# Altium footprint library LukaLIBRARY.PcbLib: 784 footprints (part 45 of 49)
Each footprint in its own frame and in the unit in brackets; x right, y up, seen from the top. Pads: shape width x height; smd on the part's side, far side on the other; paste and mask are expansions set on the pad; w line width, h text height; cw(c..) or ccw(c..) is an arc to the next point about the centre after c.
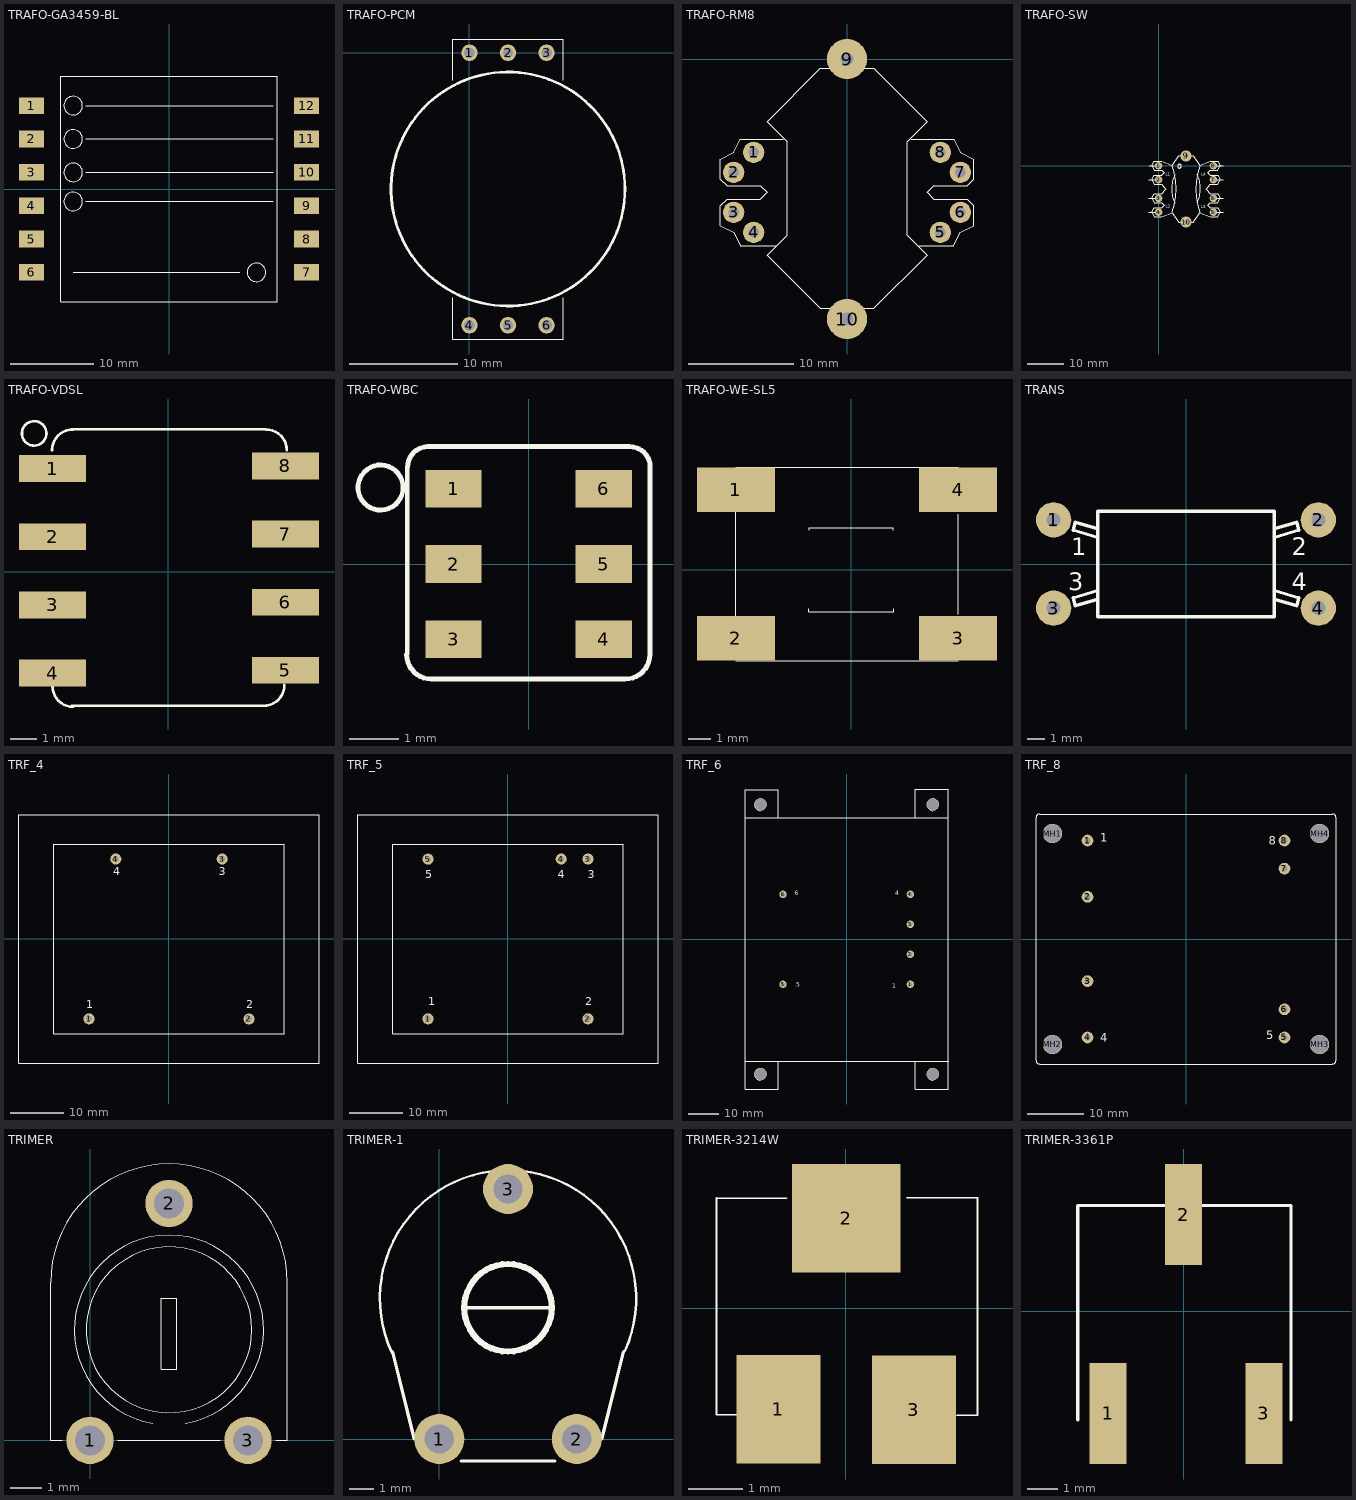
[diagram p44: the footprints below, top view; thin cyan lines are the x and y axes]

## TRAFO-GA3459-BL [mm]
pads (12):
  rect 3x2 smd mask-25.4: 1(-16.5,10) 2(-16.5,6) 3(-16.5,2) 4(-16.5,-2) 5(-16.5,-6) 6(-16.5,-10) 7(16.5,-10) 8(16.5,-6) 9(16.5,-2) 10(16.5,2) 11(16.5,6) 12(16.5,10)
Top Overlay:
  circle w0.01: c-11.5,-1.5 r1.118
  circle w0.01: c-11.5,6 r1.118
  circle w0.01: c10.5,-10 r1.118
  circle w0.01: c-11.5,10 r1.118
  circle w0.01: c-11.5,2 r1.118
  lines w0.01: -11.5,-10 8.5,-10 ; -10,-1.5 12.5,-1.5 ; -10,2 12.5,2 ; -10,6 12.5,6 ; -10,10 12.5,10 ; -10,10 12.5,10 ; -10,10 12.5,10 ; -13,-13.5 -13,13.5 13,13.5 13,-13.5 -13,-13.5
Top Solder:
  region: -18,-11 -15,-11 -15,-9 -18,-9
  region: -18,-3 -15,-3 -15,-1 -18,-1
  region: -18,5 -15,5 -15,7 -18,7
  region: -18,-7 -15,-7 -15,-5 -18,-5
  region: -18,1 -15,1 -15,3 -18,3
  region: -18,9 -15,9 -15,11 -18,11
  region: 15,-11 18,-11 18,-9 15,-9
  region: 15,-3 18,-3 18,-1 15,-1
  region: 15,5 18,5 18,7 15,7
  region: 15,-7 18,-7 18,-5 15,-5
  region: 15,1 18,1 18,3 15,3
  region: 15,9 18,9 18,11 15,11

## TRAFO-PCM [mil]
pads (6):
  round 60 hole 38: 1(0,0) 2(140,0) 3(280,0) 4(0,-990) 5(140,-990) 6(280,-990)
Top Overlay:
  circle w10: c140,-495 r425
  lines w1: -60,-890 -60,-1040 340,-1040 340,-890 ; -60,-100 -60,50 340,50 340,-100

## TRAFO-RM8 [mil]
pads (10):
  round 80 hole 40: 1(-350,-350) 2(-425,-425) 3(-425,-575) 4(-350,-650) 5(350,-650) 6(425,-575) 7(425,-425) 8(350,-350)
  round 150 hole 50: 9(0,0) 10(0,-975)
Top Overlay:
  lines w3.94: -265,-700 -400,-700 -425,-650 -475,-625 -475,-550 -450,-525 -325,-525 -300,-500 -325,-475 -450,-475 -475,-450 -475,-375 -425,-350 -400,-300 -240,-300 ; 225,-535 225,-310 300,-235 100,-35 0,-35 -100,-35 -300,-235 -225,-310 -225,-510 -225,-660 -300,-735 -100,-935 0,-935 100,-935 300,-735 225,-660 225,-510 ; 240,-300 400,-300 425,-350 475,-375 475,-450 450,-475 325,-475 300,-500 325,-525 450,-525 475,-550 475,-625 425,-650 400,-700 270,-700

## TRAFO-SW [mil]
pads (10):
  round 80 hole 40 mask-1000: 1(0,0) 2(0,-150) 3(0,-350) 4(0,-500) 5(590,-500) 6(590,-350) 7(590,-150) 8(590,0)
  round 120 hole 40 mask-1000: 9(295,105) 10(295,-605)
Top Overlay:
  circle w7.87: c225,-5 r20
  lines w7.87: -105,-500 -30,-500 ; -105,-350 -30,-350 ; -105,-150 -30,-150 ; -100,0 -30,0 ; 144.9,-500.28 ccw(c-565,-247.5) 144.9,5.28 ; 174.88,-404.75 cw(c495,-250) 174.88,-95.25 ; 265,-605 215,-605 145,-505 35,-550 -45,-550 -75,-500 -45,-450 35,-450 60,-425 35,-400 -45,-400 -75,-350 -45,-300 35,-300 75,-250 35,-200 -45,-200 -75,-150 -45,-100 35,-100 60,-75 35,-50 -45,-50 -75,0 -45,50 35,50 145,5 215,105 265,105 ; 325,-605 375,-605 445,-505 555,-550 635,-550 665,-500 635,-450 555,-450 530,-425 555,-400 635,-400 665,-350 635,-300 555,-300 515,-250 555,-200 635,-200 665,-150 635,-100 555,-100 530,-75 555,-50 635,-50 665,0 635,50 555,50 445,5 375,105 325,105 ; 415.12,-399.75 ccw(c95,-245) 415.12,-90.25 ; 445.1,-505.28 cw(c1155,-252.5) 445.1,0.28 ; 620,-500 695,-500 ; 620,-350 695,-350 ; 620,-150 695,-150 ; 620,0 695,0
  text "L3" at 460,-455 h31.25
  text "L4" at 460,-105 h31.25
  text "L2" at 75,-450 h31.25
  text "L1" at 75,-110 h31.25
Top Solder:
  drawing of 10 lines, arcs and shapes, not listed
Bottom Solder:
  drawing of 10 lines, arcs and shapes, not listed

## TRAFO-VDSL [mm]
pads (8):
  rect 2.5x1 smd mask-25.4: 1(-4.32,3.84) 2(-4.32,1.3) 3(-4.32,-1.24) 4(-4.32,-3.78) 5(4.36,-3.68) 6(4.36,-1.14) 7(4.36,1.4) 8(4.36,3.94)
Top Overlay:
  circle w0.1: c-5.005,5.151 r0.457
  lines w0.1: -4.34,4.519 cw(c-3.567,4.519) -3.567,5.293 ; -4.32,-4.269 ccw(c-3.547,-4.269) -3.547,-5.043 ; -3.6,-5 3.53,-5 ; -3.6,5.3 3.6,5.3 ; 3.547,-5.003 ccw(c3.547,-4.229) 4.32,-4.229 ; 3.637,5.293 cw(c3.637,4.519) 4.41,4.519
Top Solder:
  region: -5.57,-1.74 -3.07,-1.74 -3.07,-0.74 -5.57,-0.74
  region: -5.57,-4.28 -3.07,-4.28 -3.07,-3.28 -5.57,-3.28
  region: -5.57,3.34 -3.07,3.34 -3.07,4.34 -5.57,4.34
  region: 3.11,-4.18 5.61,-4.18 5.61,-3.18 3.11,-3.18
  region: 3.11,-1.64 5.61,-1.64 5.61,-0.64 3.11,-0.64
  region: 3.11,3.44 5.61,3.44 5.61,4.44 3.11,4.44
  region: -5.57,0.8 -3.07,0.8 -3.07,1.8 -5.57,1.8
  region: 3.11,0.9 5.61,0.9 5.61,1.9 3.11,1.9

## TRAFO-WBC [mil]
pads (6):
  rect 45x30 smd mask-1000: 1(-60,60) 2(-60,0) 3(-60,-60) 4(60,-60) 5(60,0) 6(60,60)
Top Overlay:
  circle w3.94: c-118.31,61.06 r18
  lines w3.94: -97.46,-72.2 ccw(c-77.78,-72.2) -77.78,-91.89 ; -97,-72 -97,78 ; -96.69,77.52 cw(c-80.57,77.52) -80.57,93.63 ; -81,94 80,94 ; -78,-92 76,-92 ; 77.15,-91.89 ccw(c77.15,-72.2) 96.83,-72.2 ; 80.94,93.63 cw(c80.94,77.52) 97.06,77.52 ; 97,-71 97,79
Top Solder:
  region: -103.31,-43.31 -16.69,-43.31 -16.69,43.31 -103.31,43.31
  region: -103.31,16.69 -16.69,16.69 -16.69,103.31 -103.31,103.31
  region: -103.31,-103.31 -16.69,-103.31 -16.69,-16.69 -103.31,-16.69
  region: 16.69,16.69 103.31,16.69 103.31,103.31 16.69,103.31
  region: 16.69,-43.31 103.31,-43.31 103.31,43.31 16.69,43.31
  region: 16.69,-103.31 103.31,-103.31 103.31,-16.69 16.69,-16.69

## TRAFO-WE-SL5 [mm]
pads (4):
  rect 3.5x2 smd mask-25.4: 1(-5.2,3.6) 2(-5.2,-3.1) 3(4.8,-3.1) 4(4.8,3.6)
Top Overlay:
  lines w0.03: -5.2,-4.1 4.8,-4.1 ; -5.2,-2.1 -5.2,2.6 ; -5.2,4.6 4.8,4.6 ; -1.91,-1.76 -1.91,-1.9 1.9,-1.9 1.9,-1.76 ; -1.9,1.76 -1.9,1.89 1.89,1.89 1.89,1.77 ; 4.8,-2 4.8,2.5
Top Solder:
  region: 6.55,-2.1 3.05,-2.1 3.05,-4.1 6.55,-4.1
  region: 6.55,4.6 3.05,4.6 3.05,2.6 6.55,2.6
  region: -3.45,4.6 -6.95,4.6 -6.95,2.6 -3.45,2.6
  region: -3.45,-2.1 -6.95,-2.1 -6.95,-4.1 -3.45,-4.1

## TRANS [mm] "Transformer; 4 Leads"
pads (4):
  round 2 hole 0.8: 1(-7.5,2.5) 2(7.5,2.5) 3(-7.5,-2.5) 4(7.5,-2.5)
Top Overlay:
  lines w0.2: -5,-2 -6.275,-2.375 -6.4,-1.925 -5,-1.5 ; -5,1.5 -6.4,1.925 -6.275,2.375 -5,2 ; 5,-2 6.275,-2.375 6.4,-1.925 5,-1.5 ; 5,1.5 6.4,1.925 6.275,2.375 5,2 ; -5,-3 5,-3 5,3 -5,3 -5,-3
  text "1" at -6.5,0.5 h1
  text "2" at 6,0.5 h1
  text "3" at -6.675,-1.5 h1
  text "4" at 6,-1.5 h1

## TRF_4 [mil] "Transformer; 4 Leads"
pads (4):
  round 82 hole 42: 1(-590.83,-590) 2(590.83,-590.83) 3(393.33,590.83) 4(-393.33,590.83)
Top Overlay:
  lines w8: -1108.33,-916.67 1108.33,-916.67 1108.33,916.67 -1108.33,916.67 -1108.33,-916.67 ; -850,-700 -850,700 850,700 850,-700 -850,-700
  text "1" at -610.83,-510 h59.06
  text "2" at 569.17,-510 h59.06
  text "4" at -410.83,470 h59.06
  text "3" at 369.17,470 h59.06

## TRF_5 [mil] "Transformer; 5 Leads"
pads (5):
  round 82 hole 42: 1(-590.83,-590.42) 2(590.83,-590.42) 3(590.83,590.42) 4(393.33,590.42) 5(-590.83,589.58)
Top Overlay:
  lines w8: -1108.33,-917.08 1108.33,-917.08 1108.33,916.25 -1108.33,916.25 -1108.33,-917.08 ; -850,-700.42 -850,699.58 850,699.58 850,-700.42 -850,-700.42
  text "2" at 569.17,-490.42 h59.06
  text "3" at 589.17,449.58 h59.06
  text "4" at 369.17,449.58 h59.06
  text "1" at -590.83,-490.42 h59.06
  text "5" at -610.83,449.58 h59.06

## TRF_6 [mil] "Transformer; 6 Leads"
pads (10):
  round 98 hole 52: 1(836.67,-590.83) 2(836.67,-196.67) 3(836.67,196.67) 4(836.67,590.83) 5(-836.67,-590.83) 6(-836.67,590.83)
  round 165 hole 152: MH1(-1131.67,-1771.67) MH2(1131.67,-1771.67) MH3(1131.67,1771.67) MH4(-1131.67,1771.67)
Top Overlay:
  lines w8: -1333.33,-1600 1341.67,-1600 ; -1333.33,1600 1333.33,1600 ; -1133.33,-1850 cw(c-1133.33,-1775) -1133.33,-1700 ; -1133.33,1691.67 cw(c-1133.33,1766.67) -1133.33,1841.67 ; -900,-1600 -900,-1966.67 -1333.33,-1966.67 -1333.33,1966.67 -900,1966.67 -900,1600 ; 900,-1600 900,-1966.67 1333.33,-1966.67 1333.33,1966.67 ; 900,1600 900,1975 1333.33,1975 ; 1133.33,-1850 cw(c1133.33,-1775) 1133.33,-1700 ; 1133.33,1691.67 cw(c1133.33,1766.67) 1133.33,1841.67
  text "6" at -680,580 h59.06
  text "4" at 640,580 h59.06
  text "1" at 600,-640 h59.06
  text "5" at -660,-620 h59.06

## TRF_8 [mil] "Transformer; 8 Leads"
pads (12):
  round 82 hole 42: 1(-689.17,689.17) 2(-689.17,295) 3(-689.17,-295) 4(-689.17,-689.17) 5(689.17,-689.17) 6(689.17,-492.5) 7(689.17,492.5) 8(689.17,689.17)
  round 135 hole 125: MH1(-935,738.33) MH2(-935,-738.33) MH3(935,-738.33) MH4(935,738.33)
Top Overlay:
  lines w8: -1050,-850 ccw(c-1025,-850) -1025,-875 1025,-875 ccw(c1025,-850) 1050,-850 1050,850 ccw(c1025,850) 1025,875 -1025,875 ccw(c-1025,850) -1050,850 -1050,-850
  text "1" at -600,680 h59.06
  text "5" at 560,-700 h59.06
  text "8" at 580,660 h59.06
  text "4" at -600,-720 h59.06

## TRIMER [mil]
pads (3):
  round 60 hole 38: 1(0,0) 2(100,300) 3(200,0)
Top Overlay:
  circle w1: c100,140 r105
  lines w1: -35,0 -50,0 -50,200 cw(c100,200) 250,200 250,0 235,0 ; 35,0 165,0 ; 79.16,21.82 cw(c100,140) 120.84,21.82 ; 90,90 90,180 110,180 110,90 90,90

## TRIMER-1 [mil]
pads (3):
  round 80 hole 47: 1(0,0) 2(220,0) 3(110,400)
Top Overlay:
  circle w10: c110,210 r70
  lines w3.94: -75.39,137.37 cw(c110,225) 297.19,141.27
  lines w5: -75,140 -40,0 ; 35,-35 185,-35 ; 40,210 175,210 ; 260,0 295,140

## TRIMER-3214W [mm]
pads (3):
  rect 1.55x2 smd mask-25.4: 1(-1.24,-1.86) 3(1.26,-1.87)
  rect 2x2 smd mask-25.4: 2(0.01,1.66)
Top Overlay:
  lines w0.03: -2.38,2.03 -1.09,2.03 ; -2.38,2.04 -2.38,-1.96 -2,-1.96 ; 1.13,2.04 2.42,2.04 ; 2.05,-1.97 2.43,-1.97 2.43,2.04
Top Solder:
  region: -0.99,0.66 1.01,0.66 1.01,2.66 -0.99,2.66
  region: 0.485,-2.87 2.035,-2.87 2.035,-0.87 0.485,-0.87
  region: -2.015,-2.86 -0.465,-2.86 -0.465,-0.86 -2.015,-0.86

## TRIMER-3361P [mm]
pads (3):
  rect 1.2x3.3 smd mask-25.4: 1(-2.46,-3.33) 2(0,3.15) 3(2.62,-3.33)
Top Overlay:
  lines w0.1: -3.45,-3.55 -3.45,3.45 0,3.45 ; 0.05,3.45 3.5,3.45 3.5,-3.55
Top Solder:
  region: -1.86,-4.98 -1.86,-1.68 -3.06,-1.68 -3.06,-4.98
  region: 0.6,1.5 0.6,4.8 -0.6,4.8 -0.6,1.5
  region: 3.22,-4.98 3.22,-1.68 2.02,-1.68 2.02,-4.98